# Altium footprint library TUNA_AL-CAP_Lib.PcbLib: 133 footprints (part 7 of 9)
Each footprint in its own frame and in the unit in brackets; x right, y up, seen from the top. Pads: shape width x height; smd on the part's side, far side on the other; paste and mask are expansions set on the pad; w line width, h text height; cw(c..) or ccw(c..) is an arc to the next point about the centre after c.
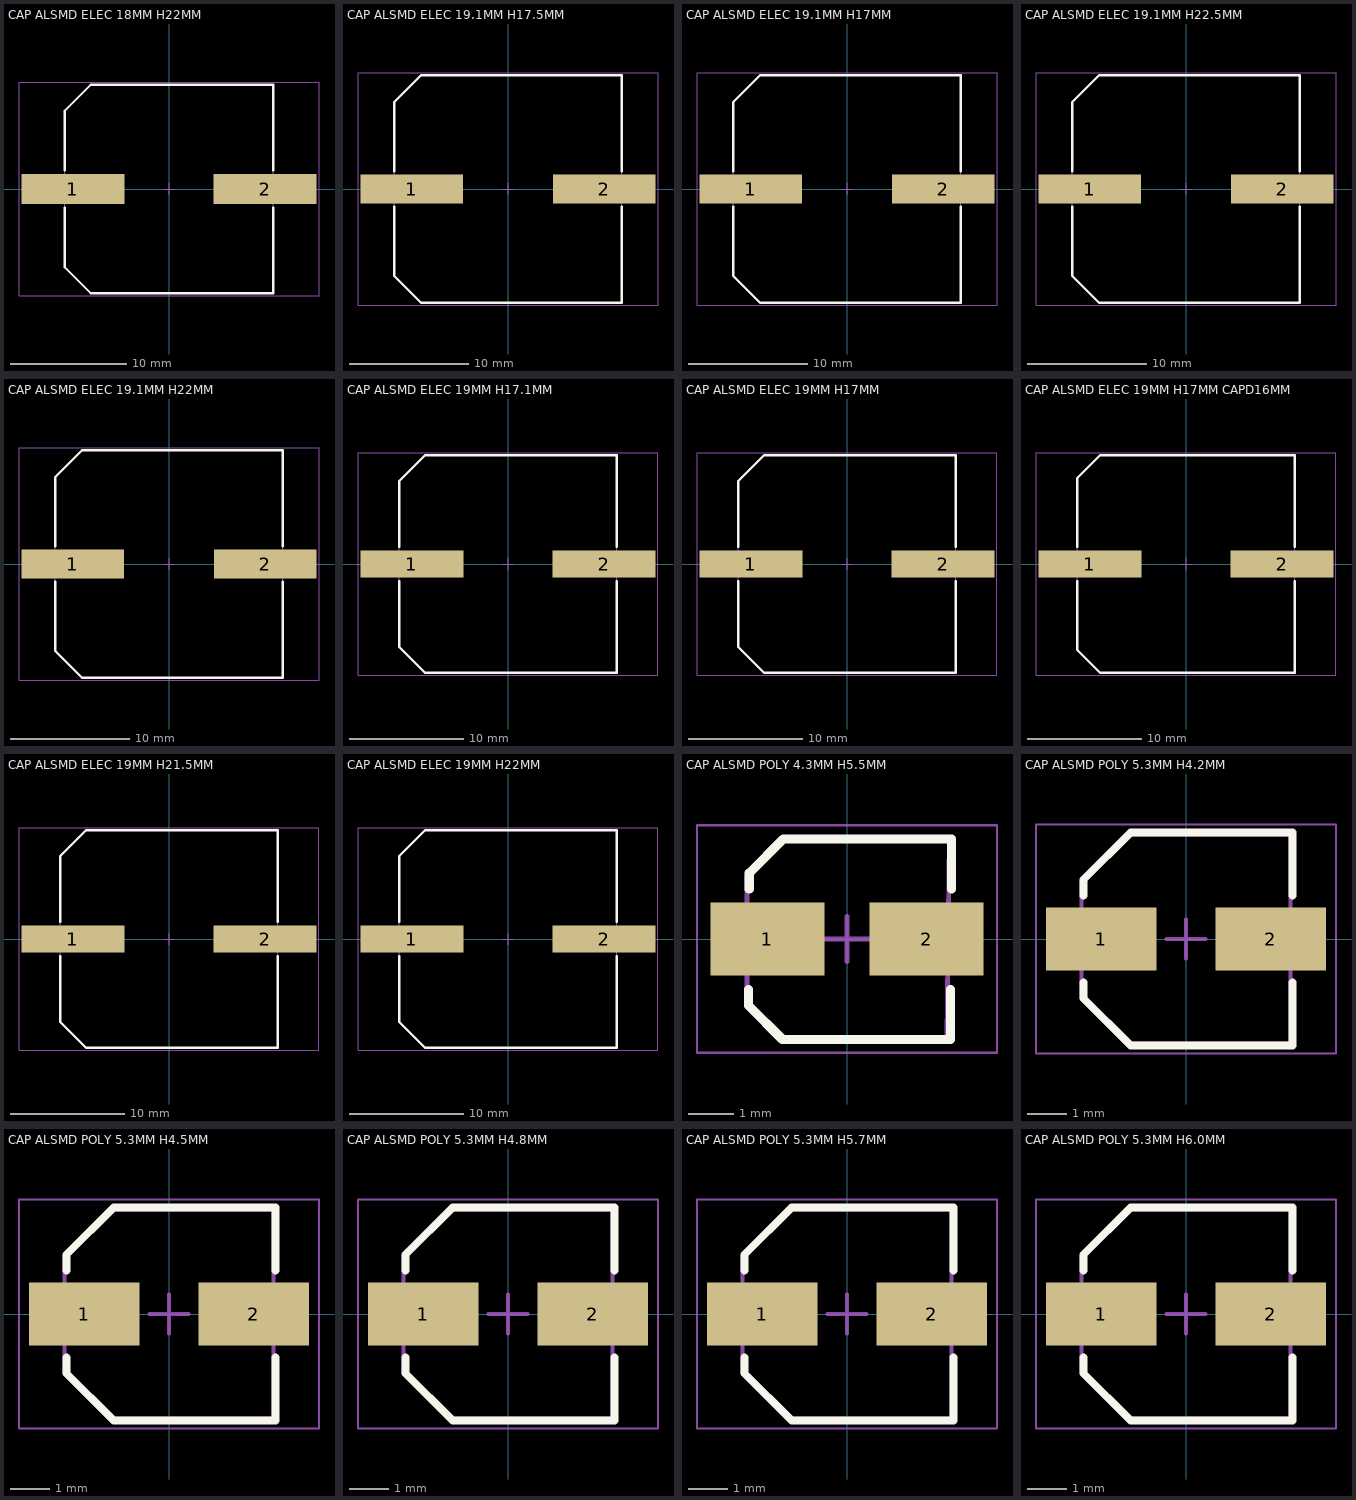
[diagram p6: the footprints below, top view; thin cyan lines are the x and y axes]

## CAP ALSMD ELEC 18MM H22MM [mm] "Aluminum SMD Electrolytic Capacitor, 18.00mm Land Size, 18.00mm Diameter, 22.00mm Height, 21.00mm Maximum Leads Span"
height 1.3
pads (2):
  rect 8.9x2.6 smd: 1(-8.3,0) 2(8.3,0)
Top Overlay:
  lines w0.2: -9,-1.6 -9,-6.75 -6.75,-9 9,-9 9,-1.6 ; -9,1.6 -9,6.75 -6.75,9 9,9 9,1.6
Mechanical 13:
  lines w0.1: -9,-6.75 -6.75,-9 9,-9 9,9 -6.75,9 -9,6.75 -9,-6.75
Mechanical 15:
  lines w0.05: -12.95,-9.2 12.95,-9.2 12.95,9.2 -12.95,9.2 -12.95,-9.2
  lines w0.1: -0.5,0 0.5,0 ; 0,-0.5 0,0.5
3D body ".STEP": height 22, standoff 0, extent -10.5,-9 10.5,9

## CAP ALSMD ELEC 19.1MM H17.5MM [mm] "Aluminum SMD Electrolytic Capacitor, 19.10mm Land Size, 18.00mm Diameter, 17.50mm Height, 20.10mm Maximum Leads Span"
height 1.2
pads (2):
  rect 8.6x2.4 smd: 1(-8.1,0) 2(8.1,0)
Top Overlay:
  lines w0.2: -9.55,-1.5 -9.55,-7.3 -7.3,-9.55 9.55,-9.55 9.55,-1.5 ; -9.55,1.5 -9.55,7.3 -7.3,9.55 9.55,9.55 9.55,1.5
Mechanical 13:
  lines w0.1: -9.55,-7.3 -7.3,-9.55 9.55,-9.55 9.55,9.55 -7.3,9.55 -9.55,7.3 -9.55,-7.3
Mechanical 15:
  lines w0.05: -12.6,-9.75 12.6,-9.75 12.6,9.75 -12.6,9.75 -12.6,-9.75
  lines w0.1: -0.5,0 0.5,0 ; 0,-0.5 0,0.5
3D body ".STEP": height 17.5, standoff 0, extent -10.05,-9.55 10.05,9.55

## CAP ALSMD ELEC 19.1MM H17MM [mm] "Aluminum SMD Electrolytic Capacitor, 19.10mm Land Size, 18.00mm Diameter, 17.00mm Height, 20.10mm Maximum Leads Span"
height 1.2
pads (2):
  rect 8.6x2.4 smd: 1(-8.1,0) 2(8.1,0)
Top Overlay:
  lines w0.2: -9.55,-1.5 -9.55,-7.3 -7.3,-9.55 9.55,-9.55 9.55,-1.5 ; -9.55,1.5 -9.55,7.3 -7.3,9.55 9.55,9.55 9.55,1.5
Mechanical 13:
  lines w0.1: -9.55,-7.3 -7.3,-9.55 9.55,-9.55 9.55,9.55 -7.3,9.55 -9.55,7.3 -9.55,-7.3
Mechanical 15:
  lines w0.05: -12.6,-9.75 12.6,-9.75 12.6,9.75 -12.6,9.75 -12.6,-9.75
  lines w0.1: -0.5,0 0.5,0 ; 0,-0.5 0,0.5
3D body ".STEP": height 17, standoff 0, extent -10.05,-9.55 10.05,9.55

## CAP ALSMD ELEC 19.1MM H22.5MM [mm] "Aluminum SMD Electrolytic Capacitor, 19.10mm Land Size, 18.00mm Diameter, 22.50mm Height, 20.10mm Maximum Leads Span"
height 1.2
pads (2):
  rect 8.6x2.4 smd: 1(-8.1,0) 2(8.1,0)
Top Overlay:
  lines w0.2: -9.55,-1.5 -9.55,-7.3 -7.3,-9.55 9.55,-9.55 9.55,-1.5 ; -9.55,1.5 -9.55,7.3 -7.3,9.55 9.55,9.55 9.55,1.5
Mechanical 13:
  lines w0.1: -9.55,-7.3 -9.55,7.3 -7.3,9.55 9.55,9.55 9.55,-9.55 -7.3,-9.55 -9.55,-7.3
Mechanical 15:
  lines w0.05: -12.6,-9.75 -12.6,9.75 12.6,9.75 12.6,-9.75 -12.6,-9.75
  lines w0.1: -0.5,0 0.5,0 ; 0,-0.5 0,0.5
3D body ".STEP": height 22.5, standoff 0, extent -10.05,-9.55 10.05,9.55

## CAP ALSMD ELEC 19.1MM H22MM [mm] "Aluminum SMD Electrolytic Capacitor, 19.10mm Land Size, 18.00mm Diameter, 22.00mm Height, 20.10mm Maximum Leads Span"
height 1.2
pads (2):
  rect 8.6x2.4 smd: 1(-8.1,0) 2(8.1,0)
Top Overlay:
  lines w0.2: -9.55,-1.5 -9.55,-7.3 -7.3,-9.55 9.55,-9.55 9.55,-1.5 ; -9.55,1.5 -9.55,7.3 -7.3,9.55 9.55,9.55 9.55,1.5
Mechanical 13:
  lines w0.1: -9.55,-7.3 -7.3,-9.55 9.55,-9.55 9.55,9.55 -7.3,9.55 -9.55,7.3 -9.55,-7.3
Mechanical 15:
  lines w0.05: -12.6,-9.75 12.6,-9.75 12.6,9.75 -12.6,9.75 -12.6,-9.75
  lines w0.1: -0.5,0 0.5,0 ; 0,-0.5 0,0.5
3D body ".STEP": height 22, standoff 0, extent -10.05,-9.55 10.05,9.55

## CAP ALSMD ELEC 19MM H17.1MM [mm] "Aluminum SMD Electrolytic Capacitor, 19.00mm Land Size, 18.00mm Diameter, 17.10mm Height, 21.00mm Maximum Leads Span"
height 1.2
pads (2):
  rect 9x2.4 smd: 1(-8.4,0) 2(8.4,0)
Top Overlay:
  lines w0.2: -9.5,-1.5 -9.5,-7.25 -7.25,-9.5 9.5,-9.5 9.5,-1.5 ; -9.5,1.5 -9.5,7.25 -7.25,9.5 9.5,9.5 9.5,1.5
Mechanical 13:
  lines w0.1: -9.5,-7.25 -7.25,-9.5 9.5,-9.5 9.5,9.5 -7.25,9.5 -9.5,7.25 -9.5,-7.25
Mechanical 15:
  lines w0.05: -13.1,-9.7 13.1,-9.7 13.1,9.7 -13.1,9.7 -13.1,-9.7
  lines w0.1: -0.5,0 0.5,0 ; 0,-0.5 0,0.5
3D body ".STEP": height 17.1, standoff 0, extent -10.5,-9.5 10.5,9.5

## CAP ALSMD ELEC 19MM H17MM [mm] "Aluminum SMD Electrolytic Capacitor, 19.00mm Land Size, 18.00mm Diameter, 17.00mm Height, 21.00mm Maximum Leads Span"
height 1.2
pads (2):
  rect 9x2.4 smd: 1(-8.4,0) 2(8.4,0)
Top Overlay:
  lines w0.2: -9.5,-1.5 -9.5,-7.25 -7.25,-9.5 9.5,-9.5 9.5,-1.5 ; -9.5,1.5 -9.5,7.25 -7.25,9.5 9.5,9.5 9.5,1.5
Mechanical 13:
  lines w0.1: -9.5,-7.25 -9.5,7.25 -7.25,9.5 9.5,9.5 9.5,-9.5 -7.25,-9.5 -9.5,-7.25
Mechanical 15:
  lines w0.05: -13.1,-9.7 -13.1,9.7 13.1,9.7 13.1,-9.7 -13.1,-9.7
  lines w0.1: -0.5,0 0.5,0 ; 0,-0.5 0,0.5
3D body ".STEP": height 17, standoff 0, extent -10.5,-9.5 10.5,9.5

## CAP ALSMD ELEC 19MM H17MM CAPD16MM [mm] "Aluminum SMD Electrolytic Capacitor, 19.00mm Land Size, 16.00mm Diameter, 17.00mm Height, 21.00mm Maximum Leads Span"
height 1.2
pads (2):
  rect 9x2.4 smd: 1(-8.4,0) 2(8.4,0)
Top Overlay:
  lines w0.2: -9.5,-1.5 -9.5,-7.5 -7.5,-9.5 9.5,-9.5 9.5,-1.5 ; -9.5,1.5 -9.5,7.5 -7.5,9.5 9.5,9.5 9.5,1.5
Mechanical 13:
  lines w0.1: -9.5,-7.5 -9.5,7.5 -7.5,9.5 9.5,9.5 9.5,-9.5 -7.5,-9.5 -9.5,-7.5
Mechanical 15:
  lines w0.05: -13.1,-9.7 -13.1,9.7 13.1,9.7 13.1,-9.7 -13.1,-9.7
  lines w0.1: -0.5,0 0.5,0 ; 0,-0.5 0,0.5
3D body ".STEP": height 17, standoff 0, extent -10.5,-9.5 10.5,9.5

## CAP ALSMD ELEC 19MM H21.5MM [mm] "Aluminum SMD Electrolytic Capacitor, 19.00mm Land Size, 18.00mm Diameter, 21.50mm Height, 21.00mm Maximum Leads Span"
height 1.2
pads (2):
  rect 9x2.4 smd: 1(-8.4,0) 2(8.4,0)
Top Overlay:
  lines w0.2: -9.5,-1.5 -9.5,-7.25 -7.25,-9.5 9.5,-9.5 9.5,-1.5 ; -9.5,1.5 -9.5,7.25 -7.25,9.5 9.5,9.5 9.5,1.5
Mechanical 13:
  lines w0.1: -9.5,-7.25 -7.25,-9.5 9.5,-9.5 9.5,9.5 -7.25,9.5 -9.5,7.25 -9.5,-7.25
Mechanical 15:
  lines w0.05: -13.1,-9.7 13.1,-9.7 13.1,9.7 -13.1,9.7 -13.1,-9.7
  lines w0.1: -0.5,0 0.5,0 ; 0,-0.5 0,0.5
3D body ".STEP": height 21.5, standoff 0, extent -10.5,-9.5 10.5,9.5

## CAP ALSMD ELEC 19MM H22MM [mm] "Aluminum SMD Electrolytic Capacitor, 19.00mm Land Size, 18.00mm Diameter, 22.00mm Height, 21.00mm Maximum Leads Span"
height 1.2
pads (2):
  rect 9x2.4 smd: 1(-8.4,0) 2(8.4,0)
Top Overlay:
  lines w0.2: -9.5,-1.5 -9.5,-7.25 -7.25,-9.5 9.5,-9.5 9.5,-1.5 ; -9.5,1.5 -9.5,7.25 -7.25,9.5 9.5,9.5 9.5,1.5
Mechanical 13:
  lines w0.1: -9.5,-7.25 -9.5,7.25 -7.25,9.5 9.5,9.5 9.5,-9.5 -7.25,-9.5 -9.5,-7.25
Mechanical 15:
  lines w0.05: -13.1,-9.7 -13.1,9.7 13.1,9.7 13.1,-9.7 -13.1,-9.7
  lines w0.1: -0.5,0 0.5,0 ; 0,-0.5 0,0.5
3D body ".STEP": height 22, standoff 0, extent -10.5,-9.5 10.5,9.5

## CAP ALSMD POLY 4.3MM H5.5MM [mm] "Aluminum Polymer Capacitor, Body 4.30x4.30x5.50mm, IPC Low Density"
height 5.5
pads (2):
  rect 2.5x1.6 smd: 1(-1.75,0) 2(1.75,0)
Top Overlay:
  lines w0.2: -2.17,-1.112 -2.17,-1.462 -1.42,-2.212 2.28,-2.212 2.28,-1.112 ; -2.15,1.1 -2.15,1.45 -1.4,2.2 2.3,2.2 2.3,1.1
Mechanical 13:
  lines w0.1: -2.2,-1.4 -1.4,-2.2 2.2,-2.2 2.25,2.2 -1.4,2.2 -2.2,1.4 -2.2,-1.4
Mechanical 15:
  lines w0.05: -3.3,-2.5 -3.3,2.5 3.3,2.5 3.3,-2.5 -3.3,-2.5
  lines w0.1: -0.5,0 0.5,0 ; 0,-0.5 0,0.5
3D body "CAP ALSMD - POLY - 4.3 x 4.3 x 5.5.step": height 5.5, standoff 0, extent -2.3,-2.2 2.3,2.2

## CAP ALSMD POLY 5.3MM H4.2MM [mm] "Aluminum Polymer Capacitor, Body 5.30x5.30x4.20mm, IPC Medium Density"
height 4.2
pads (2):
  rect 2.8x1.6 smd: 1(-2.15,0) 2(2.15,0)
Top Overlay:
  lines w0.2: -2.6,-1.1 -2.6,-1.5 -1.4,-2.7 2.7,-2.7 2.7,-1.1 ; -2.6,1.1 -2.6,1.5 -1.4,2.7 2.7,2.7 2.7,1.1
Mechanical 13:
  lines w0.1: -2.65,-1.5 -1.5,-2.65 2.65,-2.65 2.65,2.65 -1.475,2.65 -2.65,1.475 -2.65,-1.5
Mechanical 15:
  lines w0.05: -3.8,-2.9 3.8,-2.9 3.8,2.9 -3.8,2.9 -3.8,-2.9
  lines w0.1: -0.5,0 0.5,0 ; 0,-0.5 0,0.5
3D body "CAP ALSMD - POLY - 5.3 x 5.3 x 4.2.step": height 4.2, standoff 0, extent -2.95,-2.7 2.95,2.7

## CAP ALSMD POLY 5.3MM H4.5MM [mm] "Aluminum Polymer Capacitor, Body 5.30x5.30x4.50mm, IPC Medium Density"
height 4.5
pads (2):
  rect 2.8x1.6 smd: 1(-2.15,0) 2(2.15,0)
Top Overlay:
  lines w0.2: -2.6,-1.1 -2.6,-1.5 -1.4,-2.7 2.7,-2.7 2.7,-1.1 ; -2.6,1.1 -2.6,1.5 -1.4,2.7 2.7,2.7 2.7,1.1
Mechanical 13:
  lines w0.1: -2.65,-1.5 -1.5,-2.65 2.65,-2.65 2.65,2.65 -1.475,2.65 -2.65,1.475 -2.65,-1.5
Mechanical 15:
  lines w0.05: -3.8,-2.9 3.8,-2.9 3.8,2.9 -3.8,2.9 -3.8,-2.9
  lines w0.1: -0.5,0 0.5,0 ; 0,-0.5 0,0.5
3D body "CAP ALSMD - POLY - 5.3 x 5.3 x 4.5.step": height 4.5, standoff 0, extent -2.95,-2.7 2.95,2.7

## CAP ALSMD POLY 5.3MM H4.8MM [mm] "Aluminum Polymer Capacitor, Body 5.30x5.30x4.80mm, IPC Medium Density"
height 4.8
pads (2):
  rect 2.8x1.6 smd: 1(-2.15,0) 2(2.15,0)
Top Overlay:
  lines w0.2: -2.6,-1.1 -2.6,-1.5 -1.4,-2.7 2.7,-2.7 2.7,-1.1 ; -2.6,1.1 -2.6,1.5 -1.4,2.7 2.7,2.7 2.7,1.1
Mechanical 13:
  lines w0.1: -2.65,-1.5 -1.5,-2.65 2.65,-2.65 2.65,2.65 -1.475,2.65 -2.65,1.475 -2.65,-1.5
Mechanical 15:
  lines w0.05: -3.8,-2.9 3.8,-2.9 3.8,2.9 -3.8,2.9 -3.8,-2.9
  lines w0.1: -0.5,0 0.5,0 ; 0,-0.5 0,0.5
3D body "CAP ALSMD - POLY - 5.3 x 5.3 x 4.8.step": height 4.8, standoff 0, extent -2.95,-2.7 2.95,2.7

## CAP ALSMD POLY 5.3MM H5.7MM [mm] "Aluminum Polymer Capacitor, Body 5.30x5.30x5.70mm, IPC Medium Density"
height 5.7
pads (2):
  rect 2.8x1.6 smd: 1(-2.15,0) 2(2.15,0)
Top Overlay:
  lines w0.2: -2.6,-1.1 -2.6,-1.5 -1.4,-2.7 2.7,-2.7 2.7,-1.1 ; -2.6,1.1 -2.6,1.5 -1.4,2.7 2.7,2.7 2.7,1.1
Mechanical 13:
  lines w0.1: -2.65,-1.5 -2.65,1.475 -1.475,2.65 2.65,2.65 2.65,-2.65 -1.5,-2.65 -2.65,-1.5
Mechanical 15:
  lines w0.05: -3.8,-2.9 -3.8,2.9 3.8,2.9 3.8,-2.9 -3.8,-2.9
  lines w0.1: -0.5,0 0.5,0 ; 0,-0.5 0,0.5
3D body "CAP ALSMD - POLY - 5.3 x 5.3 x 5.7.step": height 5.7, standoff 0, extent -2.95,-2.7 2.95,2.7

## CAP ALSMD POLY 5.3MM H6.0MM [mm] "Aluminum Polymer Capacitor, Body 5.30x5.30x6.0mm, IPC Medium Density"
height 6
pads (2):
  rect 2.8x1.6 smd: 1(-2.15,0) 2(2.15,0)
Top Overlay:
  lines w0.2: -2.6,-1.1 -2.6,-1.5 -1.4,-2.7 2.7,-2.7 2.7,-1.1 ; -2.6,1.1 -2.6,1.5 -1.4,2.7 2.7,2.7 2.7,1.1
Mechanical 13:
  lines w0.1: -2.65,-1.5 -1.5,-2.65 2.65,-2.65 2.65,2.65 -1.475,2.65 -2.65,1.475 -2.65,-1.5
Mechanical 15:
  lines w0.05: -3.8,-2.9 3.8,-2.9 3.8,2.9 -3.8,2.9 -3.8,-2.9
  lines w0.1: -0.5,0 0.5,0 ; 0,-0.5 0,0.5
3D body "CAP ALSMD - POLY - 5.3 x 5.3 x 6.0.step": height 6, standoff 0, extent -2.95,-2.7 2.95,2.7